# Altium footprint library kalios.PcbLib: 404 footprints (part 23 of 26)
Each footprint in its own frame and in the unit in brackets; x right, y up, seen from the top. Pads: shape width x height; smd on the part's side, far side on the other; paste and mask are expansions set on the pad; w line width, h text height; cw(c..) or ccw(c..) is an arc to the next point about the centre after c.
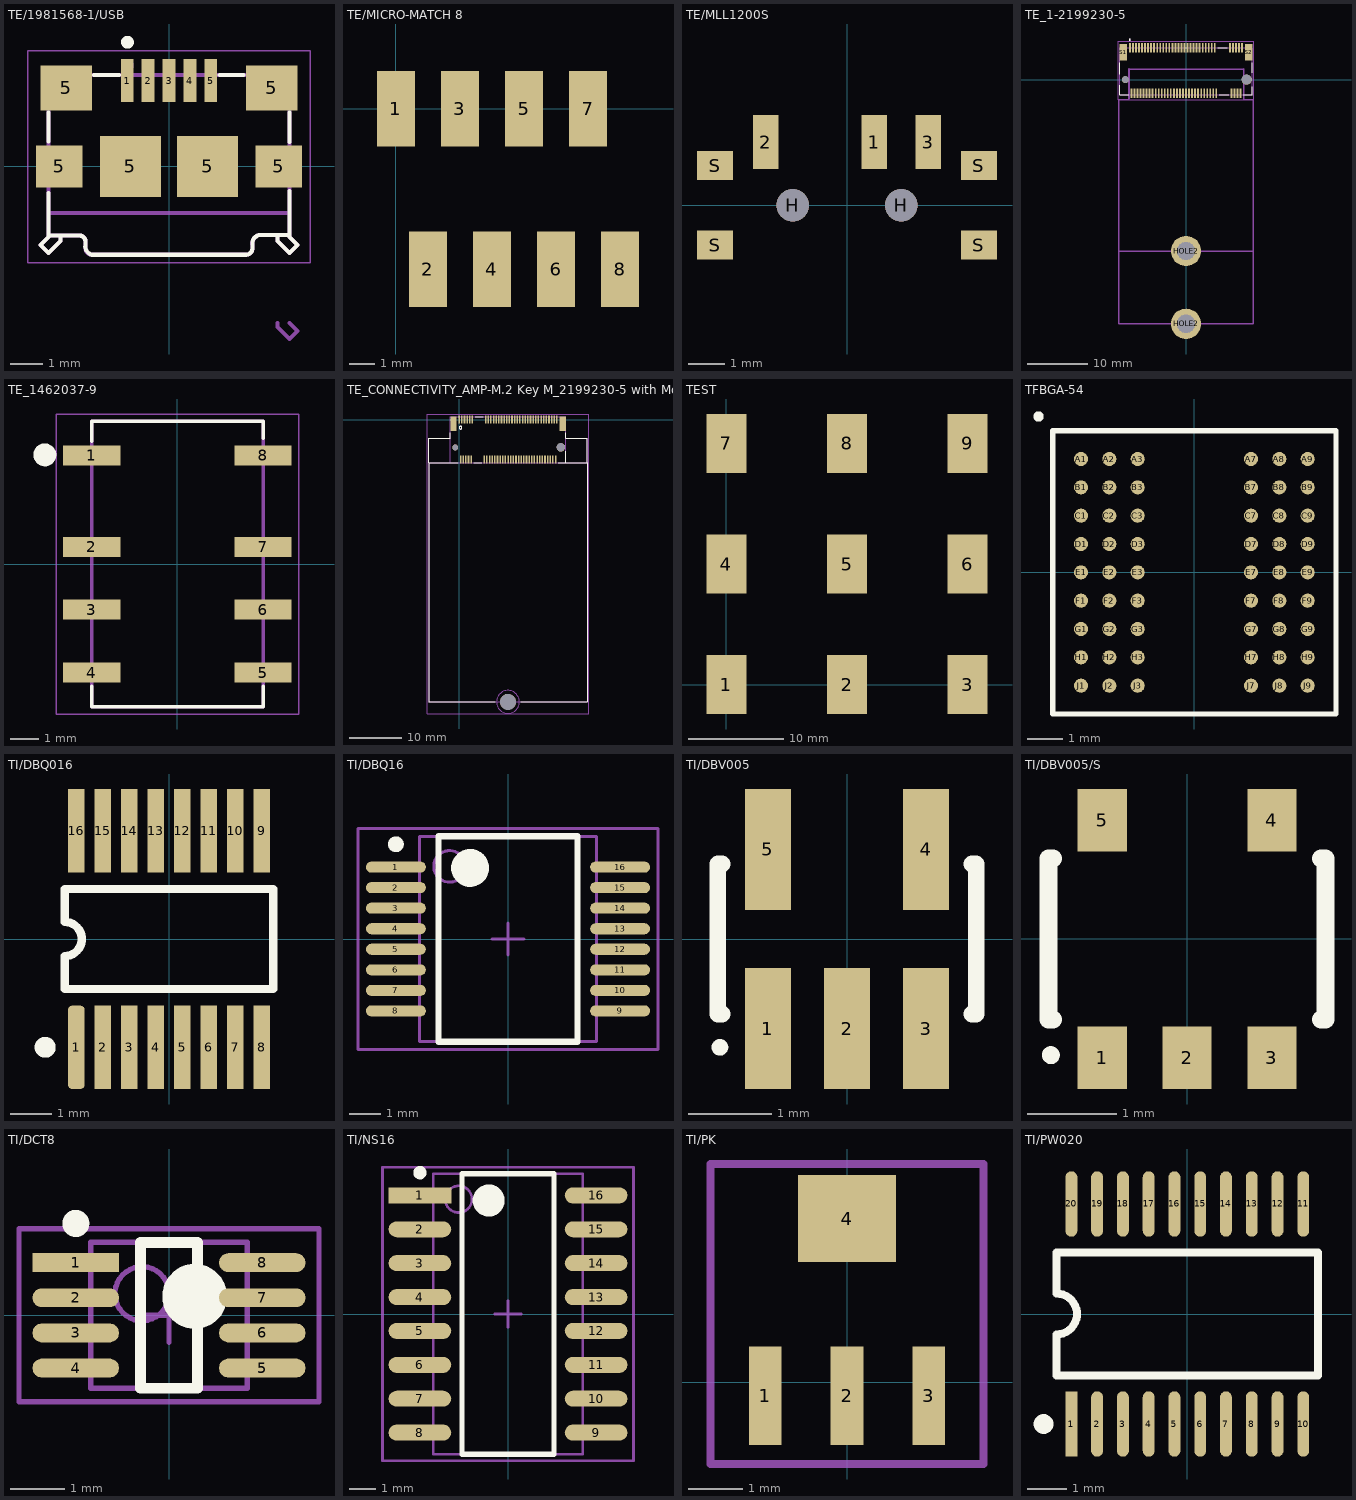
[diagram p22: the footprints below, top view; thin cyan lines are the x and y axes]

## TE/1981568-1/USB [mm]
pads (11):
  rect 0.4x1.35 smd: 1(-1.3,2.675) 2(-0.65,2.675) 3(0,2.675) 4(0.65,2.675) 5(1.3,2.675)
  rect 1.45x1.3 smd: 5(-3.425,0) 5(3.425,0)
  rect 1.6x1.4 smd: 5(-3.2,2.45) 5(3.2,2.45)
  rect 1.9x1.9 smd: 5(-1.2,0) 5(1.2,0)
Top Overlay:
  circle w0.2: c-1.295,3.87 r0.1
  lines w0.127: -3.75,-2.2 -4,-2.45 -3.75,-2.7 -3.375,-2.325 -3.375,-2.2 ; -3.75,-0.825 -3.75,-2.15 -2.8,-2.15 cw(c-2.8,-2.35) -2.6,-2.35 -2.6,-2.415 ccw(c-2.332,-2.482) -2.399,-2.75 ; -3.75,0.775 -3.75,1.685 ; -2.4,-2.75 2.4,-2.75 ; -2.34,2.85 -1.56,2.85 ; 1.58,2.85 2.32,2.85 ; 2.399,-2.75 ccw(c2.395,-2.545) 2.6,-2.541 ; 2.6,-2.54 2.6,-2.34 ; 2.6,-2.342 cw(c2.863,-2.402) 2.923,-2.14 ; 2.925,-2.14 3.75,-2.14 3.75,-0.765 ; 3.375,-2.2 3.375,-2.325 3.75,-2.7 4,-2.45 3.75,-2.2 ; 3.75,0.765 3.75,1.675
Top 3D Body:
  circle w0.2: c-1.3,3.148 r0.1
  lines w0.127: -3.78,-0.415 -3.98,-0.415 -3.98,0.445 -3.76,0.445 ; -3.75,-2.2 -4,-2.45 -3.75,-2.7 -3.375,-2.325 -3.375,-2.2 ; 2.6,-2.465 2.6,-2.55 cw(c2.4,-2.55) 2.4,-2.75 -2.4,-2.75 cw(c-2.4,-2.55) -2.6,-2.55 -2.6,-2.35 ccw(c-2.8,-2.35) -2.8,-2.15 -3.75,-2.15 -3.75,-1.45 ; 2.6,-2.463 cw(c2.863,-2.402) 2.802,-2.14 ; 2.8,-2.14 3.75,-2.14 3.75,-1.45 ; 3.375,-4.875 3.375,-5 3.75,-5.375 4,-5.125 3.75,-4.875 ; 3.375,-2.2 3.375,-2.325 3.75,-2.7 4,-2.45 3.75,-2.2 ; 3.76,0.425 4.02,0.425 4.02,-0.435 3.77,-0.435 ; -3.75,-1.45 -3.75,2.85 3.75,2.85 3.75,-1.45 ; -3.75,-1.45 3.75,-1.45
  text "PCB EDGE" at -1.144,-2.026 h0.41
Top Courtyard:
  lines w0.05: -4.4,-3 -4.4,3.6 4.4,3.6 4.4,-3 -4.4,-3
3D body "1981568-1.stp.STEP": height 2.81, standoff -0.27, extent -4,-2.679 4,2.921

## TE/MICRO-MATCH 8 [mm]
pads (8):
  rect 1.5x3 smd: 1(0,0) 2(1.27,-6.35) 3(2.54,0) 4(3.81,-6.35) 5(5.08,0) 6(6.35,-6.35) 7(7.62,0) 8(8.89,-6.35)
Top Designator:
  text ".Designator" at -3.198,-3.683 h1.52
3D body "C-0188275-78-3.STEP": height 5.2, standoff -0.05, extent -1.625,-6.599 10.465,0.301

## TE/MLL1200S [mm]
pads (9):
  rect 0.7x1.5 smd: 1(0.75,1.75) 2(-2.25,1.75) 3(2.25,1.75)
  round 0.9 hole 0.9: H(-1.5,0) H(1.5,0)
  rect 1x0.8 smd: S(-3.65,-1.1) S(-3.65,1.1) S(3.65,-1.1) S(3.65,1.1)
Top Designator:
  text ".Designator" at -7.618,-0.515 h1.52
3D body "c-1437575-1-a-3d.STEP": height 1.4, standoff -0.5, extent -3.85,-2.616 3.85,2.184

## TE_1-2199230-5 [mm]
pads (73):
  rect 0.3x1.55 smd: 1(-9.25,5.275) 2(-9,-2.275) 3(-8.75,5.275) 4(-8.5,-2.275) 5(-8.25,5.275) 6(-8,-2.275) 7(-7.75,5.275) 8(-7.5,-2.275) 9(-7.25,5.275) 10(-7,-2.275) 11(-6.75,5.275) 12(-6.5,-2.275) 13(-6.25,5.275) 14(-6,-2.275) 15(-5.75,5.275) 16(-5.5,-2.275) 17(-5.25,5.275) 18(-5,-2.275) 19(-4.75,5.275) 20(-4.5,-2.275) 21(-4.25,5.275) 22(-4,-2.275) 23(-3.75,5.275) 24(-3.5,-2.275) 25(-3.25,5.275) 26(-3,-2.275) 27(-2.75,5.275) 28(-2.5,-2.275) 29(-2.25,5.275) 30(-2,-2.275) 31(-1.75,5.275) 32(-1.5,-2.275) 33(-1.25,5.275) 34(-1,-2.275) 35(-0.75,5.275) 36(-0.5,-2.275) 37(-0.25,5.275) 38(0,-2.275) 39(0.25,5.275) 40(0.5,-2.275) 41(0.75,5.275) 42(1,-2.275) 43(1.25,5.275) 44(1.5,-2.275) 45(1.75,5.275) 46(2,-2.275) 47(2.25,5.275) 48(2.5,-2.275) 49(2.75,5.275) 50(3,-2.275) 51(3.25,5.275) 52(3.5,-2.275) 53(3.75,5.275) 54(4,-2.275) 55(4.25,5.275) 56(4.5,-2.275) 57(4.75,5.275) 58(5,-2.275) 67(7.25,5.275) 68(7.5,-2.275) 69(7.75,5.275) 70(8,-2.275) 71(8.25,5.275) 72(8.5,-2.275) 73(8.75,5.275) 74(9,-2.275) 75(9.25,5.275)
  round 5 hole 3: HOLE2(0,-40.25) HOLE2(0,-28.25)
  rect 1.2x2.75 smd: S1(-10.35,4.5) S2(10.35,4.5)
  round 1.15 hole 1.15 unplated: ""(-10,0)
  round 1.65 hole 1.65 unplated: ""(10,0)
Top Overlay:
  circle w0.2: c-9.25,6.6 r0.1
  lines w0.127: -10.95,-0.895 -10.95,-2.5 -9.47,-2.5 ; -10.95,0.895 -10.95,2.805 ; 5.22,5.25 6.78,5.25 ; 5.47,-2.5 7.03,-2.5 ; 9.47,-2.5 10.95,-2.5 10.95,-1.145 ; 10.95,1.145 10.95,2.8
Top 3D Body:
  circle w0.2: c-9.25,6.6 r0.1
  lines w0.127: -10.95,-2.5 10.95,-2.5 10.95,5.25 -10.95,5.25 -10.95,-2.5
Top Courtyard:
  lines w0.05: -11.2,-3.3 -11.2,6.3 11.2,6.3 11.2,-3.3 -11.2,-3.3
  lines w0.254: -11.049,-28.321 11.049,-28.321 ; -9.398,1.75 9.525,1.75 ; -9.398,1.778 -9.398,-3.175 -9.525,-3.302 -11.049,-3.302 -11.049,-40.259 11.049,-40.259 11.049,-3.302 9.525,-3.302 9.525,1.778
Top Designator:
  text ".Designator" at -7.618,-18.534 h1.52
3D body "1-2199230-5.STEP": height 4.09, standoff -0.62, extent -10.95,-2.833 10.95,5.867
3D body "9774015243.stp": height 1.5, standoff -1.4, extent -2.175,-42.418 2.175,-38.074
3D body "9774015243.stp": height 1.5, standoff -1.4, extent -2.175,-30.353 2.175,-26.009

## TE_1462037-9 [mm]
pads (8):
  rect 2x0.7 smd: 1(-3,3.8) 2(-3,0.6) 3(-3,-1.6) 4(-3,-3.8) 5(3,-3.8) 6(3,-1.6) 7(3,0.6) 8(3,3.8)
Top Overlay:
  circle w0.4: c-4.64,3.82 r0.2
  lines w0.127: -3,-4.28 -3,-5 3,-5 3,-4.28 ; -3,4.29 -3,5 3,5 3,4.4
Top 3D Body:
  lines w0.127: -3,-5 -3,5 3,5 3,-5 -3,-5
Top Courtyard:
  lines w0.05: -4.25,-5.25 -4.25,5.25 4.25,5.25 4.25,-5.25 -4.25,-5.25
3D body "2-1462039-9.stp.STEP": height 5.65, standoff 0, extent -3.758,-5 3.758,5

## TE_CONNECTIVITY_AMP-M.2 Key M_2199230-5 with Module 50mm [mm] "M.2 0.5PITCH 42H KEY M 15U'' AU"
height 4.2
pads (72):
  rect 0.3x1.55 smd: 1(0,0) 2(0.25,-7.55) 3(0.5,0) 4(0.75,-7.55) 5(1,0) 6(1.25,-7.55) 7(1.5,0) 8(1.75,-7.55) 9(2,0) 10(2.25,-7.55) 11(2.5,0) 20(4.75,-7.55) 21(5,0) 22(5.25,-7.55) 23(5.5,0) 24(5.75,-7.55) 25(6,0) 26(6.25,-7.55) 27(6.5,0) 28(6.75,-7.55) 29(7,0) 30(7.25,-7.55) 31(7.5,0) 32(7.75,-7.55) 33(8,0) 34(8.25,-7.55) 35(8.5,0) 36(8.75,-7.55) 37(9,0) 38(9.25,-7.55) 39(9.5,0) 40(9.75,-7.55) 41(10,0) 42(10.25,-7.55) 43(10.5,0) 44(10.75,-7.55) 45(11,0) 46(11.25,-7.55) 47(11.5,0) 48(11.75,-7.55) 49(12,0) 50(12.25,-7.55) 51(12.5,0) 52(12.75,-7.55) 53(13,0) 54(13.25,-7.55) 55(13.5,0) 56(13.75,-7.55) 57(14,0) 58(14.25,-7.55) 59(14.5,0) 60(14.75,-7.55) 61(15,0) 62(15.25,-7.55) 63(15.5,0) 64(15.75,-7.55) 65(16,0) 66(16.25,-7.55) 67(16.5,0) 68(16.75,-7.55) 69(17,0) 70(17.25,-7.55) 71(17.5,0) 72(17.75,-7.55) 73(18,0) 74(18.25,-7.55) 75(18.5,0)
  rect 1.2x2.75 smd: 76(-1.1,-0.775) 77(19.6,-0.775)
  round 1.1 hole 1.1 unplated: HOLE1(-0.75,-5.275)
  round 3 hole 3 unplated: HOLE2(9.225,-53.5)
  round 1.6 hole 1.6 unplated: HOLE2(19.25,-5.275)
Top Overlay:
  circle w0.2: c0.25,-1.55 r0.25
  lines w0.2: -1.7,-2.5 -1.7,-3.505 -5.775,-3.505 -5.775,-8.15 ; -0.199,-8.15 -5.775,-8.15 ; 2.75,-8.15 4.25,-8.15 ; 3,0.55 4.5,0.55 ; 6.8,-53.5 -5.775,-53.5 -5.775,-8.15 ; 11.7,-53.5 24.225,-53.5 24.225,-8.15 ; 18.75,-8.15 20.2,-8.15 ; 20.2,-6.05 20.2,-8.15 ; 20.2,-2.5 20.2,-3.505 24.225,-3.505 24.225,-8.15 ; 20.2,-8.15 24.225,-8.15
Top Assembly (Mech11):
  circle w0.2: c0.25,-1.55 r0.25
  lines w0.2: -1.7,-8.15 -1.7,-3.505 ; -5.775,-8.15 -5.775,-53.5 24.225,-53.5 24.225,-8.15 ; -5.775,-8.15 20.2,-8.15 ; -5.775,-8.15 -5.775,-3.505 -1.7,-3.505 ; -1.7,-3.505 -1.7,0.55 20.2,0.55 20.2,-3.505 ; 20.2,-8.15 20.2,-3.505 ; 20.2,-8.15 24.225,-8.15 ; 20.2,-3.505 24.225,-3.505 24.225,-8.15
  text ".Designator" at 5.025,-4.1 h1
Top 3D Body:
  circle w0.1: c9.22,-53.5 r2.175
  circle w0.2: c0.25,-1.55 r0.25
  lines w0.2: -1.7,-8.15 -1.7,-3.505 ; -5.775,-8.15 -5.775,-53.5 24.225,-53.5 24.225,-8.15 ; -5.775,-8.15 20.2,-8.15 ; -5.775,-8.15 -5.775,-3.505 -1.7,-3.505 ; -1.7,-3.505 -1.7,0.55 20.2,0.55 20.2,-3.505 ; 20.2,-8.15 20.2,-3.505 ; 20.2,-8.15 24.225,-8.15 ; 20.2,-3.505 24.225,-3.505 24.225,-8.15
Top Courtyard:
  lines w0.05: -6.025,-55.8 -6.025,1.05 24.5,1.05 24.5,-55.8 -6.025,-55.8
Top Designator:
  text ".Designator" at 1.62,-27.883 h1.52
3D body "FN980m_3D_200407.stp": height 4.55, standoff 1.15, extent -5.725,-53.075 24.275,-3.075
3D body "c-2199230-5-b2-3d.stp": height 4.09, standoff -0.62, extent -1.7,-8.075 20.2,0.625
3D body "9774015243.stp": height 2.9, standoff 0, extent 7.05,-55.677 11.4,-51.333

## TEST [mm]
pads (9):
  rect 4.2x6.2 smd: 1(0,0) 2(12.7,0) 3(25.4,0) 4(0,12.7) 5(12.7,12.7) 6(25.4,12.7) 7(0,25.4) 8(12.7,25.4) 9(25.4,25.4)
Top Designator:
  text ".Designator" at 5.082,12.192 h1.52

## TFBGA-54 [mm]
pads (54):
  round 0.4 smd paste-1: A1(-3.2,3.2) A2(-2.4,3.2) A3(-1.6,3.2) A7(1.6,3.2) A8(2.4,3.2) A9(3.2,3.2) B1(-3.2,2.4) B2(-2.4,2.4) B3(-1.6,2.4) B7(1.6,2.4) B8(2.4,2.4) B9(3.2,2.4) C1(-3.2,1.6) C2(-2.4,1.6) C3(-1.6,1.6) C7(1.6,1.6) C8(2.4,1.6) C9(3.2,1.6) D1(-3.2,0.8) D2(-2.4,0.8) D3(-1.6,0.8) D7(1.6,0.8) D8(2.4,0.8) D9(3.2,0.8) E1(-3.2,0) E2(-2.4,0) E3(-1.6,0) E7(1.6,0) E8(2.4,0) E9(3.2,0) F1(-3.2,-0.8) F2(-2.4,-0.8) F3(-1.6,-0.8) F7(1.6,-0.8) F8(2.4,-0.8) F9(3.2,-0.8) G1(-3.2,-1.6) G2(-2.4,-1.6) G3(-1.6,-1.6) G7(1.6,-1.6) G8(2.4,-1.6) G9(3.2,-1.6) H1(-3.2,-2.4) H2(-2.4,-2.4) H3(-1.6,-2.4) H7(1.6,-2.4) H8(2.4,-2.4) H9(3.2,-2.4) J1(-3.2,-3.2) J2(-2.4,-3.2) J3(-1.6,-3.2) J7(1.6,-3.2) J8(2.4,-3.2) J9(3.2,-3.2)
Top Overlay:
  circle w0.15: c-4.4,4.4 r0.071
  lines w0.15: -4,-4 -4,4 4,4 4,-4 -4,-4
3D body "TF-BGA54L.STEP": height 0.65, standoff -0.05, extent -4,-4 4,4

## TI/DBQ016 [mm] "SSOP; 16 Leads; Body Width 3.9 mm; Pitch 0.635 mm"
height 1.76
pads (16):
  rrect50% 0.4x2 smd: 1(-2.222,-2.6)
  rect 0.4x2 smd: 2(-1.587,-2.6) 3(-0.953,-2.6) 4(-0.318,-2.6) 5(0.318,-2.6) 6(0.953,-2.6) 7(1.587,-2.6) 8(2.222,-2.6) 9(2.222,2.6) 10(1.587,2.6) 11(0.953,2.6) 12(0.318,2.6) 13(-0.318,2.6) 14(-0.953,2.6) 15(-1.587,2.6) 16(-2.222,2.6)
Top Overlay:
  circle w0.25: c-2.973,-2.6 r0.125
  lines w0.2: -2.5,-1.2 -2.5,-0.408 ccw(c-2.5,0) -2.5,0.408 -2.5,1.2 2.5,1.2 2.5,-1.2 -2.5,-1.2
Top Designator:
  text ".Designator" at -7.929,-0.508 h1.52
3D body "User Library-ssop16p500x440ls065h200.STEP": height 2, standoff 0, extent -2.515,-3.302 2.485,3.098

## TI/DBQ16 [mm] "SOP, 16-Leads, Body 6.5x5.6mm (max), Pitch 0.65mm, IPC Medium Density"
height 2
pads (16):
  oval 1.9x0.35 smd: 1(-3.55,2.275) 2(-3.55,1.625) 3(-3.55,0.975) 4(-3.55,0.325) 5(-3.55,-0.325) 6(-3.55,-0.975) 7(-3.55,-1.625) 8(-3.55,-2.275) 9(3.55,-2.275) 10(3.55,-1.625) 11(3.55,-0.975) 12(3.55,-0.325) 13(3.55,0.325) 14(3.55,0.975) 15(3.55,1.625) 16(3.55,2.275)
Top Overlay:
  circle w0.6: c-1.2,2.25 r0.3
  circle w0.25: c-3.55,3 r0.125
  lines w0.2: -2.2,-3.25 2.2,-3.25 2.2,3.25 -2.2,3.25 -2.2,-3.25
Top 3D Body:
  circle w0.1: c-1.85,2.3 r0.5
  lines w0.1: -2.8,-3.25 2.8,-3.25 2.8,3.25 -2.8,3.25 -2.8,-3.25
Top Courtyard:
  lines w0.1: -0.5,0 0.5,0 ; 0,-0.5 0,0.5 ; -4.75,-3.5 4.75,-3.5 4.75,3.5 -4.75,3.5 -4.75,-3.5
Top Designator:
  text ".Designator" at -7.618,-0.508 h1.52
3D body "User Library-ssop16p500x440ls065h200.STEP": height 2, standoff 0, extent -3.2,-2.5 3.2,2.5

## TI/DBV005 [mm] "SOT-23/SC-74A; 5 Leads; Body 3 x 3 mm, inc. leads (LxW max)"
height 1.45
pads (5):
  rect 0.55x1.45 smd: 1(-0.95,-1.075) 2(0,-1.075) 3(0.95,-1.075) 4(0.95,1.075) 5(-0.95,1.075)
Top Overlay:
  circle w0.1: c-1.525,-1.3 r0.05
  lines w0.2: -1.5,-0.9 -1.55,-0.9 -1.55,0.9 -1.5,0.9 ; 1.5,-0.9 1.55,-0.9 1.55,0.9 1.5,0.9
Top Designator:
  text ".Designator" at -7.618,-0.508 h1.52
3D body "SOT23-5-1.STEP": height 1.3, standoff 0, extent -1.5,-1.5 1.5,1.5

## TI/DBV005/S [mm] "SOT-23/SC-74A; 5 Leads; Body 3 x 3 mm, inc. leads (LxW max)"
height 1.45
pads (5):
  rect 0.55x0.7 smd: 1(-0.95,-1.329) 2(0,-1.329) 3(0.95,-1.329) 4(0.95,1.329) 5(-0.95,1.329)
Top Overlay:
  circle w0.1: c-1.525,-1.3 r0.05
  lines w0.2: -1.5,-0.9 -1.55,-0.9 -1.55,0.9 -1.5,0.9 ; 1.5,-0.9 1.55,-0.9 1.55,0.9 1.5,0.9
Top Designator:
  text ".Designator" at -7.618,-0.508 h1.52
3D body "SOT23-5-1.STEP": height 1.3, standoff 0, extent -1.5,-1.5 1.5,1.5

## TI/DCT8 [mm] "TSOP, 8-Leads, Body 2.7x2.9mm (max), Pitch 0.65mm, IPC Medium Density"
height 1.3
pads (8):
  rect 1.6x0.35 smd: 1(-1.725,0.975)
  oval 1.6x0.35 smd: 2(-1.725,0.325) 3(-1.725,-0.325) 4(-1.725,-0.975) 5(1.725,-0.975) 6(1.725,-0.325) 7(1.725,0.325) 8(1.725,0.975)
Top Overlay:
  circle w0.25: c-1.725,1.7 r0.125
  circle w0.6: c0.475,0.35 r0.3
  lines w0.2: -0.525,-1.35 -0.525,1.35 0.525,1.35 0.525,-1.35 -0.525,-1.35
Top 3D Body:
  circle w0.1: c-0.5,0.4 r0.5
  lines w0.1: -1.45,-1.35 -1.45,1.35 1.45,1.35 1.45,-1.35 -1.45,-1.35
Top Courtyard:
  lines w0.1: -0.5,0 0.5,0 ; 0,-0.5 0,0.5 ; -2.775,-1.6 -2.775,1.6 2.775,1.6 2.775,-1.6 -2.775,-1.6
Top Designator:
  text ".Designator" at -7.618,-0.358 h1.52
3D body: height 1.3, standoff 0.1, extent -1.45,-1.35 1.45,1.35

## TI/NS16 [mm] "SOIC, 16-Leads, Body 10.5x5.6mm (max), Pitch 1.27mm, IPC Medium Density"
height 2
pads (16):
  rect 2.35x0.6 smd: 1(-3.3,4.445)
  oval 2.35x0.6 smd: 2(-3.3,3.175) 3(-3.3,1.905) 4(-3.3,0.635) 5(-3.3,-0.635) 6(-3.3,-1.905) 7(-3.3,-3.175) 8(-3.3,-4.445) 9(3.3,-4.445) 10(3.3,-3.175) 11(3.3,-1.905) 12(3.3,-0.635) 13(3.3,0.635) 14(3.3,1.905) 15(3.3,3.175) 16(3.3,4.445)
Top Overlay:
  circle w0.25: c-3.3,5.295 r0.125
  circle w0.6: c-0.725,4.25 r0.3
  lines w0.2: -1.725,-5.25 -1.725,5.25 1.725,5.25 1.725,-5.25 -1.725,-5.25
Top 3D Body:
  circle w0.1: c-1.85,4.3 r0.5
  lines w0.1: -2.8,-5.25 -2.8,5.25 2.8,5.25 2.8,-5.25 -2.8,-5.25
Top Courtyard:
  lines w0.1: -0.5,0 0.5,0 ; 0,-0.5 0,0.5 ; -4.7,-5.5 -4.7,5.5 4.7,5.5 4.7,-5.5 -4.7,-5.5
Top Designator:
  text ".Designator" at -7.618,-0.508 h1.52
3D body: height 2, standoff 0.1, extent -2.8,-5.25 2.8,5.25

## TI/PK [mm]
pads (4):
  rect 0.6x1.8 smd: 1(-1.5,-0.25) 2(0,-0.25) 3(1.5,-0.25)
  rect 1.8x1.6 smd: 4(0,3)
Top Courtyard:
  lines w0.15: -2.5,-1.5 -2.5,4 2.5,4 2.5,-1.5 -2.5,-1.5
Top Designator:
  text ".Designator" at -7.618,0.742 h1.52
3D body "SOT89-3.STEP": height 1.54, standoff 0, extent -2.25,-0.75 2.25,3.5

## TI/PW020 [mm] "Shrink Small Outline; 20 Leads; Body Width 4.4 mm; Pitch 0.65 mm"
height 1.2
pads (20):
  rect 0.3x1.65 smd: 1(-2.925,-2.775)
  oval 0.3x1.65 smd: 2(-2.275,-2.775) 3(-1.625,-2.775) 4(-0.975,-2.775) 5(-0.325,-2.775) 6(0.325,-2.775) 7(0.975,-2.775) 8(1.625,-2.775) 9(2.275,-2.775) 10(2.925,-2.775) 11(2.925,2.775) 12(2.275,2.775) 13(1.625,2.775) 14(0.975,2.775) 15(0.325,2.775) 16(-0.325,2.775) 17(-0.975,2.775) 18(-1.625,2.775) 19(-2.275,2.775) 20(-2.925,2.775)
Top Overlay:
  circle w0.25: c-3.625,-2.775 r0.125
  lines w0.2: -3.3,-1.55 3.3,-1.55 3.3,1.55 -3.3,1.55 -3.3,0.517 cw(c-3.3,0) -3.3,-0.517 -3.3,-1.55
Top Designator:
  text ".Designator" at -7.855,-0.508 h1.52